# Altium footprint library IC.PCBLIB: 359 footprints (part 9 of 23)
Each footprint in its own frame and in the unit in brackets; x right, y up, seen from the top. Pads: shape width x height; smd on the part's side, far side on the other; paste and mask are expansions set on the pad; w line width, h text height; cw(c..) or ccw(c..) is an arc to the next point about the centre after c.
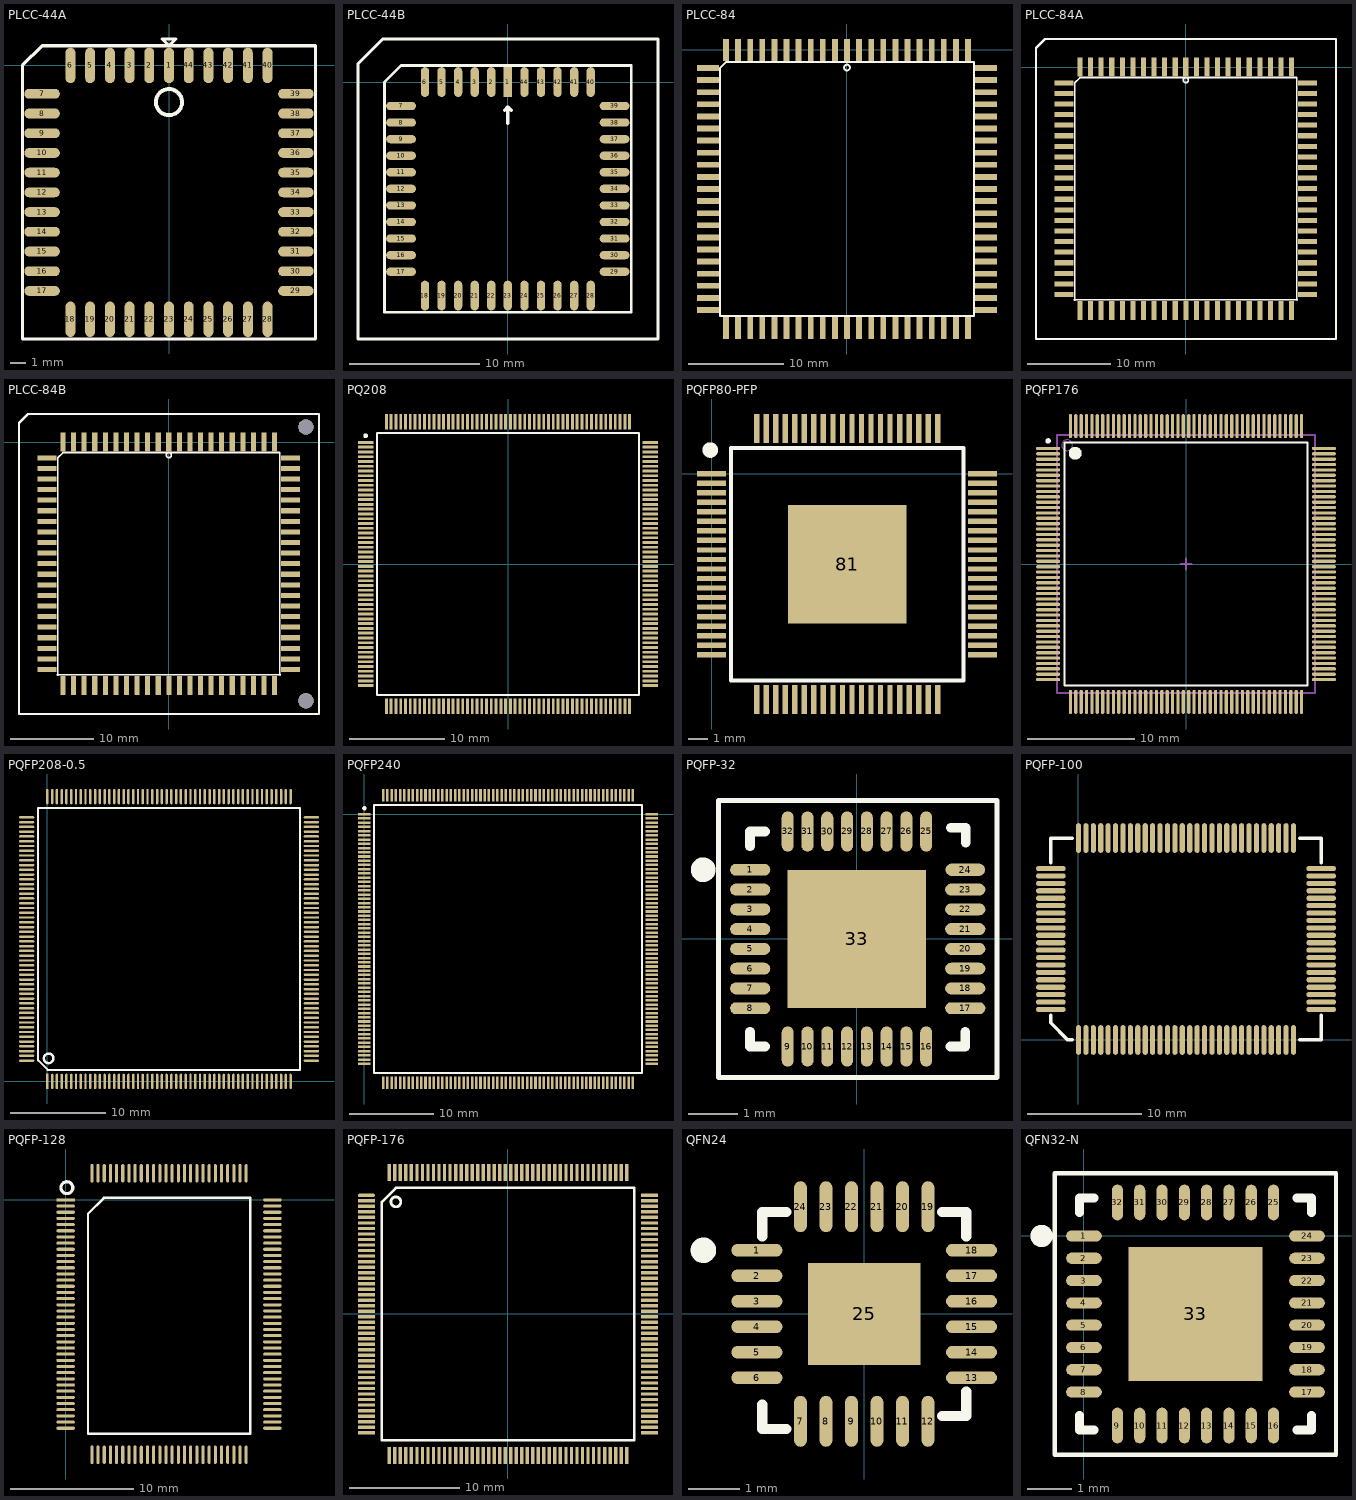
[diagram p8: the footprints below, top view; thin cyan lines are the x and y axes]

## PLCC-44A [mil]
pads (44):
  oval 25x90 smd: 1(0,0) 2(-50,0) 3(-100,0) 4(-150,0) 5(-200,0) 6(-250,0) 18(-250,-644) 19(-200,-644) 20(-150,-644) 21(-100,-644) 22(-50,-644) 23(0,-644) 24(50,-644) 25(100,-644) 26(150,-644) 27(200,-644) 28(250,-644) 40(250,0) 41(200,0) 42(150,0) 43(100,0) 44(50,0)
  oval 90x25 smd: 7(-322,-72) 8(-322,-122) 9(-322,-172) 10(-322,-222) 11(-322,-272) 12(-322,-322) 13(-322,-372) 14(-322,-422) 15(-322,-472) 16(-322,-522) 17(-322,-572) 29(322,-572) 30(322,-522) 31(322,-472) 32(322,-422) 33(322,-372) 34(322,-322) 35(322,-272) 36(322,-222) 37(322,-172) 38(322,-122) 39(322,-72)
TopOverlay:
  lines w8: -372,-694 372,-694 372,50 -322,50 -372,0 -372,-694 ; -17,67 0,67 17,67 0,50 -17,67
  lines w10: 32.87,-90.09 ccw(c-0.12,-93) 33,-93

## PLCC-44B [mil]
pads (44):
  rect 25x90 smd: 1(0,0)
  oval 25x90 smd: 2(-50,0) 3(-100,0) 4(-150,0) 5(-200,0) 6(-250,0) 18(-250,-644) 19(-200,-644) 20(-150,-644) 21(-100,-644) 22(-50,-644) 23(0,-644) 24(50,-644) 25(100,-644) 26(150,-644) 27(200,-644) 28(250,-644) 40(250,0) 41(200,0) 42(150,0) 43(100,0) 44(50,0)
  oval 90x25 smd: 7(-322,-72) 8(-322,-122) 9(-322,-172) 10(-322,-222) 11(-322,-272) 12(-322,-322) 13(-322,-372) 14(-322,-422) 15(-322,-472) 16(-322,-522) 17(-322,-572) 29(322,-572) 30(322,-522) 31(322,-472) 32(322,-422) 33(322,-372) 34(322,-322) 35(322,-272) 36(322,-222) 37(322,-172) 38(322,-122) 39(322,-72)
TopOverlay:
  lines w8: -372,-694 -372,0 -322,50 372,50 372,-694 -372,-694
  lines w10: -10,-85 0,-75 ; 0,-125 0,-75 ; 10,-85 0,-75 ; -452,-775 453,-775 453,130 -377,130 -452,55 -452,-775

## PLCC-84 [mil]
height 100
pads (84):
  rect 24x90 smd: 1(0,0) 2(-49.61,0.28) 3(-99.61,0.28) 4(-149.61,0.28) 5(-199.61,0.28) 6(-249.61,0.28) 7(-299.61,0.28) 8(-349.61,0.28) 9(-399.61,0.28) 10(-449.61,0.28) 11(-499.61,0.28) 33(-499.61,-1149.72) 34(-449.61,-1149.72) 35(-399.61,-1149.72) 36(-349.61,-1149.72) 37(-299.61,-1149.72) 38(-249.61,-1149.72) 39(-199.61,-1149.72) 40(-149.61,-1149.72) 41(-99.61,-1149.72) 42(-49.61,-1149.72) 43(0.39,-1149.72) 44(50.39,-1149.72) 45(100.39,-1149.72) 46(150.39,-1149.72) 47(200.39,-1149.72) 48(250.39,-1149.72) 49(300.39,-1149.72) 50(350.39,-1149.72) 51(400.39,-1149.72) 52(450.39,-1149.72) 53(500.39,-1149.72) 75(500.39,0.28) 76(450.39,0.28) 77(400.39,0.28) 78(350.39,0.28) 79(300.39,0.28) 80(250.39,0.28) 81(200.39,0.28) 82(150.39,0.28) 83(100.39,0.28) 84(50.39,0.28)
  rect 90x24 smd: 12(-574.61,-74.72) 13(-574.61,-124.72) 14(-574.61,-174.72) 15(-574.61,-224.72) 16(-574.61,-274.72) 17(-574.61,-324.72) 18(-574.61,-374.72) 19(-574.61,-424.72) 20(-574.61,-474.72) 21(-574.61,-524.72) 22(-574.61,-574.72) 23(-574.61,-624.72) 24(-574.61,-674.72) 25(-574.61,-724.72) 26(-574.61,-774.72) 27(-574.61,-824.72) 28(-574.61,-874.72) 29(-574.61,-924.72) 30(-574.61,-974.72) 31(-574.61,-1024.72) 32(-574.61,-1074.72) 54(575.39,-1074.72) 55(575.39,-1024.72) 56(575.39,-974.72) 57(575.39,-924.72) 58(575.39,-874.72) 59(575.39,-824.72) 60(575.39,-774.72) 61(575.39,-724.72) 62(575.39,-674.72) 63(575.39,-624.72) 64(575.39,-574.72) 65(575.39,-524.72) 66(575.39,-474.72) 67(575.39,-424.72) 68(575.39,-374.72) 69(575.39,-324.72) 70(575.39,-274.72) 71(575.39,-224.72) 72(575.39,-174.72) 73(575.39,-124.72) 74(575.39,-74.72)
TopOverlay:
  circle w8: c0.39,-72.72 r12
  lines w8: -524.61,-1099.72 525.39,-1099.72 525.39,-49.72 -499.61,-49.72 -524.61,-74.72 -524.61,-1099.72

## PLCC-84A [mil]
height 100
pads (84):
  rect 24x90 smd: 1(0,0) 2(-49.61,0.28) 3(-99.61,0.28) 4(-149.61,0.28) 5(-199.61,0.28) 6(-249.61,0.28) 7(-299.61,0.28) 8(-349.61,0.28) 9(-399.61,0.28) 10(-449.61,0.28) 11(-499.61,0.28) 33(-499.61,-1149.72) 34(-449.61,-1149.72) 35(-399.61,-1149.72) 36(-349.61,-1149.72) 37(-299.61,-1149.72) 38(-249.61,-1149.72) 39(-199.61,-1149.72) 40(-149.61,-1149.72) 41(-99.61,-1149.72) 42(-49.61,-1149.72) 43(0.39,-1149.72) 44(50.39,-1149.72) 45(100.39,-1149.72) 46(150.39,-1149.72) 47(200.39,-1149.72) 48(250.39,-1149.72) 49(300.39,-1149.72) 50(350.39,-1149.72) 51(400.39,-1149.72) 52(450.39,-1149.72) 53(500.39,-1149.72) 75(500.39,0.28) 76(450.39,0.28) 77(400.39,0.28) 78(350.39,0.28) 79(300.39,0.28) 80(250.39,0.28) 81(200.39,0.28) 82(150.39,0.28) 83(100.39,0.28) 84(50.39,0.28)
  rect 90x24 smd: 12(-574.61,-74.72) 13(-574.61,-124.72) 14(-574.61,-174.72) 15(-574.61,-224.72) 16(-574.61,-274.72) 17(-574.61,-324.72) 18(-574.61,-374.72) 19(-574.61,-424.72) 20(-574.61,-474.72) 21(-574.61,-524.72) 22(-574.61,-574.72) 23(-574.61,-624.72) 24(-574.61,-674.72) 25(-574.61,-724.72) 26(-574.61,-774.72) 27(-574.61,-824.72) 28(-574.61,-874.72) 29(-574.61,-924.72) 30(-574.61,-974.72) 31(-574.61,-1024.72) 32(-574.61,-1074.72) 54(575.39,-1074.72) 55(575.39,-1024.72) 56(575.39,-974.72) 57(575.39,-924.72) 58(575.39,-874.72) 59(575.39,-824.72) 60(575.39,-774.72) 61(575.39,-724.72) 62(575.39,-674.72) 63(575.39,-624.72) 64(575.39,-574.72) 65(575.39,-524.72) 66(575.39,-474.72) 67(575.39,-424.72) 68(575.39,-374.72) 69(575.39,-324.72) 70(575.39,-274.72) 71(575.39,-224.72) 72(575.39,-174.72) 73(575.39,-124.72) 74(575.39,-74.72)
TopOverlay:
  circle w8: c0.39,-61.72 r12
  lines w8: -524.61,-1099.72 525.39,-1099.72 525.39,-49.72 -499.61,-49.72 -524.61,-74.72 -524.61,-1099.72
  lines w10: -707.71,89 -707.71,90 ; -524.61,-1099.72 -524.61,-1098.61 ; 525.39,-1100.39 525.39,-1099.72 ; -707.71,90 -665,132.71 710.29,132.71 710.29,-1285.3 -707.71,-1285.3 -707.71,90

## PLCC-84B [mil]
height 100
pads (86):
  rect 24x90 smd: 1(0,0) 2(-49.61,0.28) 3(-99.61,0.28) 4(-149.61,0.28) 5(-199.61,0.28) 6(-249.61,0.28) 7(-299.61,0.28) 8(-349.61,0.28) 9(-399.61,0.28) 10(-449.61,0.28) 11(-499.61,0.28) 33(-499.61,-1149.72) 34(-449.61,-1149.72) 35(-399.61,-1149.72) 36(-349.61,-1149.72) 37(-299.61,-1149.72) 38(-249.61,-1149.72) 39(-199.61,-1149.72) 40(-149.61,-1149.72) 41(-99.61,-1149.72) 42(-49.61,-1149.72) 43(0.39,-1149.72) 44(50.39,-1149.72) 45(100.39,-1149.72) 46(150.39,-1149.72) 47(200.39,-1149.72) 48(250.39,-1149.72) 49(300.39,-1149.72) 50(350.39,-1149.72) 51(400.39,-1149.72) 52(450.39,-1149.72) 53(500.39,-1149.72) 75(500.39,0.28) 76(450.39,0.28) 77(400.39,0.28) 78(350.39,0.28) 79(300.39,0.28) 80(250.39,0.28) 81(200.39,0.28) 82(150.39,0.28) 83(100.39,0.28) 84(50.39,0.28)
  rect 90x24 smd: 12(-574.61,-74.72) 13(-574.61,-124.72) 14(-574.61,-174.72) 15(-574.61,-224.72) 16(-574.61,-274.72) 17(-574.61,-324.72) 18(-574.61,-374.72) 19(-574.61,-424.72) 20(-574.61,-474.72) 21(-574.61,-524.72) 22(-574.61,-574.72) 23(-574.61,-624.72) 24(-574.61,-674.72) 25(-574.61,-724.72) 26(-574.61,-774.72) 27(-574.61,-824.72) 28(-574.61,-874.72) 29(-574.61,-924.72) 30(-574.61,-974.72) 31(-574.61,-1024.72) 32(-574.61,-1074.72) 54(575.39,-1074.72) 55(575.39,-1024.72) 56(575.39,-974.72) 57(575.39,-924.72) 58(575.39,-874.72) 59(575.39,-824.72) 60(575.39,-774.72) 61(575.39,-724.72) 62(575.39,-674.72) 63(575.39,-624.72) 64(575.39,-574.72) 65(575.39,-524.72) 66(575.39,-474.72) 67(575.39,-424.72) 68(575.39,-374.72) 69(575.39,-324.72) 70(575.39,-274.72) 71(575.39,-224.72) 72(575.39,-174.72) 73(575.39,-124.72) 74(575.39,-74.72)
  round 72.83 hole 70.87: ""(648.39,-1222.72) ""(648.39,71.28)
TopOverlay:
  circle w8: c0.39,-61.72 r12
  lines w8: -524.61,-1099.72 525.39,-1099.72 525.39,-49.72 -499.61,-49.72 -524.61,-74.72 -524.61,-1099.72
  lines w10: -707.71,89 -707.71,90 ; -524.61,-1099.72 -524.61,-1098.61 ; 525.39,-1100.39 525.39,-1099.72 ; -707.71,90 -665,132.71 710.29,132.71 710.29,-1285.3 -707.71,-1285.3 -707.71,90

## PQ208 [mm]
height 1.2
pads (208):
  rect 1.6x0.3 smd: 1(-14.925,12.75) 2(-14.925,12.25) 3(-14.925,11.75) 4(-14.925,11.25) 5(-14.925,10.75) 6(-14.925,10.25) 7(-14.925,9.75) 8(-14.925,9.25) 9(-14.925,8.75) 10(-14.925,8.25) 11(-14.925,7.75) 12(-14.925,7.25) 13(-14.925,6.75) 14(-14.925,6.25) 15(-14.925,5.75) 16(-14.925,5.25) 17(-14.925,4.75) 18(-14.925,4.25) 19(-14.925,3.75) 20(-14.925,3.25) 21(-14.925,2.75) 22(-14.925,2.25) 23(-14.925,1.75) 24(-14.925,1.25) 25(-14.925,0.75) 26(-14.925,0.25) 27(-14.925,-0.25) 28(-14.925,-0.75) 29(-14.925,-1.25) 30(-14.925,-1.75) 31(-14.925,-2.25) 32(-14.925,-2.75) 33(-14.925,-3.25) 34(-14.925,-3.75) 35(-14.925,-4.25) 36(-14.925,-4.75) 37(-14.925,-5.25) 38(-14.925,-5.75) 39(-14.925,-6.25) 40(-14.925,-6.75) 41(-14.925,-7.25) 42(-14.925,-7.75) 43(-14.925,-8.25) 44(-14.925,-8.75) 45(-14.925,-9.25) 46(-14.925,-9.75) 47(-14.925,-10.25) 48(-14.925,-10.75) 49(-14.925,-11.25) 50(-14.925,-11.75) 51(-14.925,-12.25) 52(-14.925,-12.75) 105(14.925,-12.75) 106(14.925,-12.25) 107(14.925,-11.75) 108(14.925,-11.25) 109(14.925,-10.75) 110(14.925,-10.25) 111(14.925,-9.75) 112(14.925,-9.25) 113(14.925,-8.75) 114(14.925,-8.25) 115(14.925,-7.75) 116(14.925,-7.25) 117(14.925,-6.75) 118(14.925,-6.25) 119(14.925,-5.75) 120(14.925,-5.25) 121(14.925,-4.75) 122(14.925,-4.25) 123(14.925,-3.75) 124(14.925,-3.25) 125(14.925,-2.75) 126(14.925,-2.25) 127(14.925,-1.75) 128(14.925,-1.25) 129(14.925,-0.75) 130(14.925,-0.25) 131(14.925,0.25) 132(14.925,0.75) 133(14.925,1.25) 134(14.925,1.75) 135(14.925,2.25) 136(14.925,2.75) 137(14.925,3.25) 138(14.925,3.75) 139(14.925,4.25) 140(14.925,4.75) 141(14.925,5.25) 142(14.925,5.75) 143(14.925,6.25) 144(14.925,6.75) 145(14.925,7.25) 146(14.925,7.75) 147(14.925,8.25) 148(14.925,8.75) 149(14.925,9.25) 150(14.925,9.75) 151(14.925,10.25) 152(14.925,10.75) 153(14.925,11.25) 154(14.925,11.75) 155(14.925,12.25) 156(14.925,12.75)
  rect 0.3x1.6 smd: 53(-12.75,-14.925) 54(-12.25,-14.925) 55(-11.75,-14.925) 56(-11.25,-14.925) 57(-10.75,-14.925) 58(-10.25,-14.925) 59(-9.75,-14.925) 60(-9.25,-14.925) 61(-8.75,-14.925) 62(-8.25,-14.925) 63(-7.75,-14.925) 64(-7.25,-14.925) 65(-6.75,-14.925) 66(-6.25,-14.925) 67(-5.75,-14.925) 68(-5.25,-14.925) 69(-4.75,-14.925) 70(-4.25,-14.925) 71(-3.75,-14.925) 72(-3.25,-14.925) 73(-2.75,-14.925) 74(-2.25,-14.925) 75(-1.75,-14.925) 76(-1.25,-14.925) 77(-0.75,-14.925) 78(-0.25,-14.925) 79(0.25,-14.925) 80(0.75,-14.925) 81(1.25,-14.925) 82(1.75,-14.925) 83(2.25,-14.925) 84(2.75,-14.925) 85(3.25,-14.925) 86(3.75,-14.925) 87(4.25,-14.925) 88(4.75,-14.925) 89(5.25,-14.925) 90(5.75,-14.925) 91(6.25,-14.925) 92(6.75,-14.925) 93(7.25,-14.925) 94(7.75,-14.925) 95(8.25,-14.925) 96(8.75,-14.925) 97(9.25,-14.925) 98(9.75,-14.925) 99(10.25,-14.925) 100(10.75,-14.925) 101(11.25,-14.925) 102(11.75,-14.925) 103(12.25,-14.925) 104(12.75,-14.925) 157(12.75,14.925) 158(12.25,14.925) 159(11.75,14.925) 160(11.25,14.925) 161(10.75,14.925) 162(10.25,14.925) 163(9.75,14.925) 164(9.25,14.925) 165(8.75,14.925) 166(8.25,14.925) 167(7.75,14.925) 168(7.25,14.925) 169(6.75,14.925) 170(6.25,14.925) 171(5.75,14.925) 172(5.25,14.925) 173(4.75,14.925) 174(4.25,14.925) 175(3.75,14.925) 176(3.25,14.925) 177(2.75,14.925) 178(2.25,14.925) 179(1.75,14.925) 180(1.25,14.925) 181(0.75,14.925) 182(0.25,14.925) 183(-0.25,14.925) 184(-0.75,14.925) 185(-1.25,14.925) 186(-1.75,14.925) 187(-2.25,14.925) 188(-2.75,14.925) 189(-3.25,14.925) 190(-3.75,14.925) 191(-4.25,14.925) 192(-4.75,14.925) 193(-5.25,14.925) 194(-5.75,14.925) 195(-6.25,14.925) 196(-6.75,14.925) 197(-7.25,14.925) 198(-7.75,14.925) 199(-8.25,14.925) 200(-8.75,14.925) 201(-9.25,14.925) 202(-9.75,14.925) 203(-10.25,14.925) 204(-10.75,14.925) 205(-11.25,14.925) 206(-11.75,14.925) 207(-12.25,14.925) 208(-12.75,14.925)
TopOverlay:
  circle w0.25: c-14.925,13.45 r0.125
  lines w0.2: -13.725,-13.725 13.725,-13.725 13.725,13.725 -13.725,13.725 -13.725,-13.725

## PQFP80-PFP [mil]
height 204
pads (81):
  rect 60x11 smd: 1(0,0) 2(0,-19.68) 3(0,-39.37) 4(0,-59.06) 5(0,-78.74) 6(0,-98.43) 7(0,-118.11) 8(0,-137.8) 9(0,-157.48) 10(0,-177.17) 11(0,-196.85) 12(0,-216.54) 13(0,-236.22) 14(0,-255.91) 15(0,-275.59) 16(0,-295.28) 17(0,-314.96) 18(0,-334.65) 19(0,-354.33) 20(0,-374.02) 41(560,-374.02) 42(560,-354.33) 43(560,-334.65) 44(560,-314.96) 45(560,-295.28) 46(560,-275.59) 47(560,-255.91) 48(560,-236.22) 49(560,-216.54) 50(560,-196.85) 51(560,-177.17) 52(560,-157.48) 53(560,-137.8) 54(560,-118.11) 55(560,-98.43) 56(560,-78.74) 57(560,-59.06) 58(560,-39.37) 59(560,-19.69) 60(560,0)
  rect 11x60 smd: 21(93.43,-466.57) 22(113.11,-466.57) 23(132.8,-466.57) 24(152.48,-466.57) 25(172.17,-466.57) 26(191.85,-466.57) 27(211.54,-466.57) 28(231.22,-466.57) 29(250.91,-466.57) 30(270.59,-466.57) 31(290.28,-466.57) 32(309.96,-466.57) 33(329.65,-466.57) 34(349.33,-466.57) 35(369.02,-466.57) 36(388.7,-466.57) 37(408.39,-466.57) 38(428.07,-466.57) 39(447.76,-466.57) 40(467.44,-466.57) 61(467.44,93.43) 62(447.76,93.43) 63(428.07,93.43) 64(408.39,93.43) 65(388.7,93.43) 66(369.02,93.43) 67(349.33,93.43) 68(329.65,93.43) 69(309.96,93.43) 70(290.28,93.43) 71(270.59,93.43) 72(250.91,93.43) 73(231.22,93.43) 74(211.54,93.43) 75(191.85,93.43) 76(172.17,93.43) 77(152.48,93.43) 78(132.8,93.43) 79(113.11,93.43) 80(93.43,93.43)
  rect 244.09x244.09 smd paste+0 mask+0: 81(280.43,-187.01)
TopOverlay:
  circle w16: c-2.57,48.99 r8
  lines w8: 40.28,-427.17 40.28,53.15 520.59,53.15 520.59,-427.17 40.28,-427.17
TopSolder:
  rectangle: 302,-309 402,-209
  rectangle: 158,-309 258,-209
  rectangle: 303,-165 403,-65
  rectangle: 159,-165 259,-65

## PQFP176 [mm] "TI 28335DSPоƬ"
height 1.6
pads (176):
  oval 2.25x0.3 smd: 1(-12.825,10.75) 2(-12.825,10.25) 3(-12.825,9.75) 4(-12.825,9.25) 5(-12.825,8.75) 6(-12.825,8.25) 7(-12.825,7.75) 8(-12.825,7.25) 9(-12.825,6.75) 10(-12.825,6.25) 11(-12.825,5.75) 12(-12.825,5.25) 13(-12.825,4.75) 14(-12.825,4.25) 15(-12.825,3.75) 16(-12.825,3.25) 17(-12.825,2.75) 18(-12.825,2.25) 19(-12.825,1.75) 20(-12.825,1.25) 21(-12.825,0.75) 22(-12.825,0.25) 23(-12.825,-0.25) 24(-12.825,-0.75) 25(-12.825,-1.25) 26(-12.825,-1.75) 27(-12.825,-2.25) 28(-12.825,-2.75) 29(-12.825,-3.25) 30(-12.825,-3.75) 31(-12.825,-4.25) 32(-12.825,-4.75) 33(-12.825,-5.25) 34(-12.825,-5.75) 35(-12.825,-6.25) 36(-12.825,-6.75) 37(-12.825,-7.25) 38(-12.825,-7.75) 39(-12.825,-8.25) 40(-12.825,-8.75) 41(-12.825,-9.25) 42(-12.825,-9.75) 43(-12.825,-10.25) 44(-12.825,-10.75) 89(12.825,-10.75) 90(12.825,-10.25) 91(12.825,-9.75) 92(12.825,-9.25) 93(12.825,-8.75) 94(12.825,-8.25) 95(12.825,-7.75) 96(12.825,-7.25) 97(12.825,-6.75) 98(12.825,-6.25) 99(12.825,-5.75) 100(12.825,-5.25) 101(12.825,-4.75) 102(12.825,-4.25) 103(12.825,-3.75) 104(12.825,-3.25) 105(12.825,-2.75) 106(12.825,-2.25) 107(12.825,-1.75) 108(12.825,-1.25) 109(12.825,-0.75) 110(12.825,-0.25) 111(12.825,0.25) 112(12.825,0.75) 113(12.825,1.25) 114(12.825,1.75) 115(12.825,2.25) 116(12.825,2.75) 117(12.825,3.25) 118(12.825,3.75) 119(12.825,4.25) 120(12.825,4.75) 121(12.825,5.25) 122(12.825,5.75) 123(12.825,6.25) 124(12.825,6.75) 125(12.825,7.25) 126(12.825,7.75) 127(12.825,8.25) 128(12.825,8.75) 129(12.825,9.25) 130(12.825,9.75) 131(12.825,10.25) 132(12.825,10.75)
  oval 0.3x2.25 smd: 45(-10.75,-12.825) 46(-10.25,-12.825) 47(-9.75,-12.825) 48(-9.25,-12.825) 49(-8.75,-12.825) 50(-8.25,-12.825) 51(-7.75,-12.825) 52(-7.25,-12.825) 53(-6.75,-12.825) 54(-6.25,-12.825) 55(-5.75,-12.825) 56(-5.25,-12.825) 57(-4.75,-12.825) 58(-4.25,-12.825) 59(-3.75,-12.825) 60(-3.25,-12.825) 61(-2.75,-12.825) 62(-2.25,-12.825) 63(-1.75,-12.825) 64(-1.25,-12.825) 65(-0.75,-12.825) 66(-0.25,-12.825) 67(0.25,-12.825) 68(0.75,-12.825) 69(1.25,-12.825) 70(1.75,-12.825) 71(2.25,-12.825) 72(2.75,-12.825) 73(3.25,-12.825) 74(3.75,-12.825) 75(4.25,-12.825) 76(4.75,-12.825) 77(5.25,-12.825) 78(5.75,-12.825) 79(6.25,-12.825) 80(6.75,-12.825) 81(7.25,-12.825) 82(7.75,-12.825) 83(8.25,-12.825) 84(8.75,-12.825) 85(9.25,-12.825) 86(9.75,-12.825) 87(10.25,-12.825) 88(10.75,-12.825) 133(10.75,12.825) 134(10.25,12.825) 135(9.75,12.825) 136(9.25,12.825) 137(8.75,12.825) 138(8.25,12.825) 139(7.75,12.825) 140(7.25,12.825) 141(6.75,12.825) 142(6.25,12.825) 143(5.75,12.825) 144(5.25,12.825) 145(4.75,12.825) 146(4.25,12.825) 147(3.75,12.825) 148(3.25,12.825) 149(2.75,12.825) 150(2.25,12.825) 151(1.75,12.825) 152(1.25,12.825) 153(0.75,12.825) 154(0.25,12.825) 155(-0.25,12.825) 156(-0.75,12.825) 157(-1.25,12.825) 158(-1.75,12.825) 159(-2.25,12.825) 160(-2.75,12.825) 161(-3.25,12.825) 162(-3.75,12.825) 163(-4.25,12.825) 164(-4.75,12.825) 165(-5.25,12.825) 166(-5.75,12.825) 167(-6.25,12.825) 168(-6.75,12.825) 169(-7.25,12.825) 170(-7.75,12.825) 171(-8.25,12.825) 172(-8.75,12.825) 173(-9.25,12.825) 174(-9.75,12.825) 175(-10.25,12.825) 176(-10.75,12.825)
TopOverlay:
  circle w0.25: c-12.825,11.45 r0.125
  circle w0.6: c-10.3,10.3 r0.3
  lines w0.2: -11.3,-11.3 -11.3,11.3 11.3,11.3 11.3,-11.3 -11.3,-11.3
Mechanical13:
  circle w0.1: c-11.05,11.05 r0.5
  lines w0.2: -12,-12 -12,12 12,12 12,-12 -12,-12
Mechanical15:
  lines w0.2: -0.5,0 0.5,0 ; 0,-0.5 0,0.5

## PQFP208-0.5 [mm]
height 1.5
pads (208):
  rect 0.254x1.6 smd: 1(0,0)
  oval 0.254x1.6 smd: 2(0.5,0) 3(1,0) 4(1.5,0) 5(2,0) 6(2.5,0) 7(3,0) 8(3.5,0) 9(4,0) 10(4.5,0) 11(5,0) 12(5.5,0) 13(6,0) 14(6.5,0) 15(7,0) 16(7.5,0) 17(8,0) 18(8.5,0) 19(9,0) 20(9.5,0) 21(10,0) 22(10.5,0) 23(11,0) 24(11.5,0) 25(12,0) 26(12.5,0) 27(13,0) 28(13.5,0) 29(14,0) 30(14.5,0) 31(15,0) 32(15.5,0) 33(16,0) 34(16.5,0) 35(17,0) 36(17.5,0) 37(18,0) 38(18.5,0) 39(19,0) 40(19.5,0) 41(20,0) 42(20.5,0) 43(21,0) 44(21.5,0) 45(22,0) 46(22.5,0) 47(23,0) 48(23.5,0) 49(24,0) 50(24.5,0) 51(25,0) 52(25.5,0) 105(25.5,29.85) 106(25,29.85) 107(24.5,29.85) 108(24,29.85) 109(23.5,29.85) 110(23,29.85) 111(22.5,29.85) 112(22,29.85) 113(21.5,29.85) 114(21,29.85) 115(20.5,29.85) 116(20,29.85) 117(19.5,29.85) 118(19,29.85) 119(18.5,29.85) 120(18,29.85) 121(17.5,29.85) 122(17,29.85) 123(16.5,29.85) 124(16,29.85) 125(15.5,29.85) 126(15,29.85) 127(14.5,29.85) 128(14,29.85) 129(13.5,29.85) 130(13,29.85) 131(12.5,29.85) 132(12,29.85) 133(11.5,29.85) 134(11,29.85) 135(10.5,29.85) 136(10,29.85) 137(9.5,29.85) 138(9,29.85) 139(8.5,29.85) 140(8,29.85) 141(7.5,29.85) 142(7,29.85) 143(6.5,29.85) 144(6,29.85) 145(5.5,29.85) 146(5,29.85) 147(4.5,29.85) 148(4,29.85) 149(3.5,29.85) 150(3,29.85) 151(2.5,29.85) 152(2,29.85) 153(1.5,29.85) 154(1,29.85) 155(0.5,29.85) 156(0,29.85)
  oval 1.6x0.254 smd: 53(27.675,2.175) 54(27.675,2.675) 55(27.675,3.175) 56(27.675,3.675) 57(27.675,4.175) 58(27.675,4.675) 59(27.675,5.175) 60(27.675,5.675) 61(27.675,6.175) 62(27.675,6.675) 63(27.675,7.175) 64(27.675,7.675) 65(27.675,8.175) 66(27.675,8.675) 67(27.675,9.175) 68(27.675,9.675) 69(27.675,10.175) 70(27.675,10.675) 71(27.675,11.175) 72(27.675,11.675) 73(27.675,12.175) 74(27.675,12.675) 75(27.675,13.175) 76(27.675,13.675) 77(27.675,14.175) 78(27.675,14.675) 79(27.675,15.175) 80(27.675,15.675) 81(27.675,16.175) 82(27.675,16.675) 83(27.675,17.175) 84(27.675,17.675) 85(27.675,18.175) 86(27.675,18.675) 87(27.675,19.175) 88(27.675,19.675) 89(27.675,20.175) 90(27.675,20.675) 91(27.675,21.175) 92(27.675,21.675) 93(27.675,22.175) 94(27.675,22.675) 95(27.675,23.175) 96(27.675,23.675) 97(27.675,24.175) 98(27.675,24.675) 99(27.675,25.175) 100(27.675,25.675) 101(27.675,26.175) 102(27.675,26.675) 103(27.675,27.175) 104(27.675,27.675) 157(-2.175,27.675) 158(-2.175,27.175) 159(-2.175,26.675) 160(-2.175,26.175) 161(-2.175,25.675) 162(-2.175,25.175) 163(-2.175,24.675) 164(-2.175,24.175) 165(-2.175,23.675) 166(-2.175,23.175) 167(-2.175,22.675) 168(-2.175,22.175) 169(-2.175,21.675) 170(-2.175,21.175) 171(-2.175,20.675) 172(-2.175,20.175) 173(-2.175,19.675) 174(-2.175,19.175) 175(-2.175,18.675) 176(-2.175,18.175) 177(-2.175,17.675) 178(-2.175,17.175) 179(-2.175,16.675) 180(-2.175,16.175) 181(-2.175,15.675) 182(-2.175,15.175) 183(-2.175,14.675) 184(-2.175,14.175) 185(-2.175,13.675) 186(-2.175,13.175) 187(-2.175,12.675) 188(-2.175,12.175) 189(-2.175,11.675) 190(-2.175,11.175) 191(-2.175,10.675) 192(-2.175,10.175) 193(-2.175,9.675) 194(-2.175,9.175) 195(-2.175,8.675) 196(-2.175,8.175) 197(-2.175,7.675) 198(-2.175,7.175) 199(-2.175,6.675) 200(-2.175,6.175) 201(-2.175,5.675) 202(-2.175,5.175) 203(-2.175,4.675) 204(-2.175,4.175) 205(-2.175,3.675) 206(-2.175,3.175) 207(-2.175,2.675) 208(-2.175,2.175)
TopOverlay:
  circle w0.25: c0.135,2.413 r0.5
  lines w0.2: -0.975,2.2 -0.975,28.65 26.475,28.65 26.475,1.2 0.025,1.2
  lines w0.203: -0.975,2.2 0.025,1.2

## PQFP240 [mm]
pads (240):
  rect 1.5x0.3 smd: 1(0,0) 2(0,-0.5) 3(0,-1) 4(0,-1.5) 5(0,-2) 6(0,-2.5) 7(0,-3) 8(0,-3.5) 9(0,-4) 10(0,-4.5) 11(0,-5) 12(0,-5.5) 13(0,-6) 14(0,-6.5) 15(0,-7) 16(0,-7.5) 17(0,-8) 18(0,-8.5) 19(0,-9) 20(0,-9.5) 21(0,-10) 22(0,-10.5) 23(0,-11) 24(0,-11.5) 25(0,-12) 26(0,-12.5) 27(0,-13) 28(0,-13.5) 29(0,-14) 30(0,-14.5) 31(0,-15) 32(0,-15.5) 33(0,-16) 34(0,-16.5) 35(0,-17) 36(0,-17.5) 37(0,-18) 38(0,-18.5) 39(0,-19) 40(0,-19.5) 41(0,-20) 42(0,-20.5) 43(0,-21) 44(0,-21.5) 45(0,-22) 46(0,-22.5) 47(0,-23) 48(0,-23.5) 49(0,-24) 50(0,-24.5) 51(0,-25) 52(0,-25.5) 53(0,-26) 54(0,-26.5) 55(0,-27) 56(0,-27.5) 57(0,-28) 58(0,-28.5) 59(0,-29) 60(0,-29.5) 121(33.95,-29.5) 122(33.95,-29) 123(33.95,-28.5) 124(33.95,-28) 125(33.95,-27.5) 126(33.95,-27) 127(33.95,-26.5) 128(33.95,-26) 129(33.95,-25.5) 130(33.95,-25) 131(33.95,-24.5) 132(33.95,-24) 133(33.95,-23.5) 134(33.95,-23) 135(33.95,-22.5) 136(33.95,-22) 137(33.95,-21.5) 138(33.95,-21) 139(33.95,-20.5) 140(33.95,-20) 141(33.95,-19.5) 142(33.95,-19) 143(33.95,-18.5) 144(33.95,-18) 145(33.95,-17.5) 146(33.95,-17) 147(33.95,-16.5) 148(33.95,-16) 149(33.95,-15.5) 150(33.95,-15) 151(33.95,-14.5) 152(33.95,-14) 153(33.95,-13.5) 154(33.95,-13) 155(33.95,-12.5) 156(33.95,-12) 157(33.95,-11.5) 158(33.95,-11) 159(33.95,-10.5) 160(33.95,-10) 161(33.95,-9.5) 162(33.95,-9) 163(33.95,-8.5) 164(33.95,-8) 165(33.95,-7.5) 166(33.95,-7) 167(33.95,-6.5) 168(33.95,-6) 169(33.95,-5.5) 170(33.95,-5) 171(33.95,-4.5) 172(33.95,-4) 173(33.95,-3.5) 174(33.95,-3) 175(33.95,-2.5) 176(33.95,-2) 177(33.95,-1.5) 178(33.95,-1) 179(33.95,-0.5) 180(33.95,0)
  rect 0.3x1.5 smd: 61(2.225,-31.725) 62(2.725,-31.725) 63(3.225,-31.725) 64(3.725,-31.725) 65(4.225,-31.725) 66(4.725,-31.725) 67(5.225,-31.725) 68(5.725,-31.725) 69(6.225,-31.725) 70(6.725,-31.725) 71(7.225,-31.725) 72(7.725,-31.725) 73(8.225,-31.725) 74(8.725,-31.725) 75(9.225,-31.725) 76(9.725,-31.725) 77(10.225,-31.725) 78(10.725,-31.725) 79(11.225,-31.725) 80(11.725,-31.725) 81(12.225,-31.725) 82(12.725,-31.725) 83(13.225,-31.725) 84(13.725,-31.725) 85(14.225,-31.725) 86(14.725,-31.725) 87(15.225,-31.725) 88(15.725,-31.725) 89(16.225,-31.725) 90(16.725,-31.725) 91(17.225,-31.725) 92(17.725,-31.725) 93(18.225,-31.725) 94(18.725,-31.725) 95(19.225,-31.725) 96(19.725,-31.725) 97(20.225,-31.725) 98(20.725,-31.725) 99(21.225,-31.725) 100(21.725,-31.725) 101(22.225,-31.725) 102(22.725,-31.725) 103(23.225,-31.725) 104(23.725,-31.725) 105(24.225,-31.725) 106(24.725,-31.725) 107(25.225,-31.725) 108(25.725,-31.725) 109(26.225,-31.725) 110(26.725,-31.725) 111(27.225,-31.725) 112(27.725,-31.725) 113(28.225,-31.725) 114(28.725,-31.725) 115(29.225,-31.725) 116(29.725,-31.725) 117(30.225,-31.725) 118(30.725,-31.725) 119(31.225,-31.725) 120(31.725,-31.725) 181(31.725,2.225) 182(31.225,2.225) 183(30.725,2.225) 184(30.225,2.225) 185(29.725,2.225) 186(29.225,2.225) 187(28.725,2.225) 188(28.225,2.225) 189(27.725,2.225) 190(27.225,2.225) 191(26.725,2.225) 192(26.225,2.225) 193(25.725,2.225) 194(25.225,2.225) 195(24.725,2.225) 196(24.225,2.225) 197(23.725,2.225) 198(23.225,2.225) 199(22.725,2.225) 200(22.225,2.225) 201(21.725,2.225) 202(21.225,2.225) 203(20.725,2.225) 204(20.225,2.225) 205(19.725,2.225) 206(19.225,2.225) 207(18.725,2.225) 208(18.225,2.225) 209(17.725,2.225) 210(17.225,2.225) 211(16.725,2.225) 212(16.225,2.225) 213(15.725,2.225) 214(15.225,2.225) 215(14.725,2.225) 216(14.225,2.225) 217(13.725,2.225) 218(13.225,2.225) 219(12.725,2.225) 220(12.225,2.225) 221(11.725,2.225) 222(11.225,2.225) 223(10.725,2.225) 224(10.225,2.225) 225(9.725,2.225) 226(9.225,2.225) 227(8.725,2.225) 228(8.225,2.225) 229(7.725,2.225) 230(7.225,2.225) 231(6.725,2.225) 232(6.225,2.225) 233(5.725,2.225) 234(5.225,2.225) 235(4.725,2.225) 236(4.225,2.225) 237(3.725,2.225) 238(3.225,2.225) 239(2.725,2.225) 240(2.225,2.225)
TopOverlay:
  circle w0.25: c0,0.7 r0.125
  lines w0.2: 1.15,-30.575 32.8,-30.575 32.8,1.075 1.15,1.075 1.15,-30.575

## PQFP-32 [mil]
height 204
pads (33):
  oval 32x9.5 smd: 1(-85,55.12) 2(-85,39.37) 3(-85,23.62) 4(-85,7.87) 5(-85,-7.87) 6(-85,-23.62) 7(-85,-39.37) 8(-85,-55.12) 17(86.26,-55.12) 18(86.26,-39.37) 19(86.26,-23.62) 20(86.26,-7.87) 21(86.26,7.87) 22(86.26,23.62) 23(86.26,39.37)
  oval 9.5x32 smd: 9(-55.12,-85.63) 10(-39.37,-85.63) 11(-23.62,-85.63) 12(-7.87,-85.63) 13(7.87,-85.63) 14(23.62,-85.63) 15(39.37,-85.63) 16(55.12,-85.63) 25(55.12,85.63) 26(39.37,85.63) 27(23.62,85.63) 28(7.87,85.63) 29(-7.87,85.63) 31(-39.37,85.63) 32(-55.12,85.63)
  oval 31.5x9.84 smd: 24(86.26,55.12)
  oval 9.84x31.5 smd: 30(-23.62,85.63)
  rect 110.24x110.24 smd paste+0 mask+0: 33(0,0)
TopOverlay:
  circle w9.84: c-122.4,55.12 r4.92
  lines w3.94: -110.24,-110.24 111.5,-110.24 111.5,110.24 -110.24,110.24 -110.24,-110.24
  lines w7.87: -85,-73.82 -85,-85.63 -73.19,-85.63 ; -85,73.82 -85,85.63 -73.19,85.63 ; 74.45,-85.63 86.26,-85.63 86.26,-73.82 ; 74.85,88.58 86.66,88.58 86.66,76.77
TopSolder:
  rectangle: -55,-55 -5,-5
  rectangle: 5,5 55,55
  rectangle: -55,5 -5,55
  rectangle: 5,-55 55,-5

## PQFP-100 [mm] "QPF(14x20mm) e=0.65"
height 3
pads (100):
  oval 0.45x2.6 smd: 1(0,0) 2(0.65,0) 3(1.3,0) 4(1.95,0) 5(2.6,0) 6(3.25,0) 7(3.9,0) 8(4.55,0) 9(5.2,0) 10(5.85,0) 11(6.5,0) 12(7.15,0) 13(7.8,0) 14(8.45,0) 15(9.1,0) 16(9.75,0) 17(10.4,0) 18(11.05,0) 19(11.7,0) 20(12.35,0) 21(13,0) 22(13.65,0) 23(14.3,0) 24(14.95,0) 25(15.6,0) 26(16.25,0) 27(16.9,0) 28(17.55,0) 29(18.2,0) 30(18.85,0) 51(18.85,17.7) 52(18.2,17.7) 53(17.55,17.7) 54(16.9,17.7) 55(16.25,17.7) 56(15.6,17.7) 57(14.95,17.7) 58(14.3,17.7) 59(13.65,17.7) 60(13,17.7) 61(12.35,17.7) 62(11.7,17.7) 63(11.05,17.7) 64(10.4,17.7) 65(9.75,17.7) 66(9.1,17.7) 67(8.45,17.7) 68(7.8,17.7) 69(7.15,17.7) 70(6.5,17.7) 71(5.85,17.7) 72(5.2,17.7) 73(4.55,17.7) 74(3.9,17.7) 75(3.25,17.7) 76(2.6,17.7) 77(1.95,17.7) 78(1.3,17.7) 79(0.65,17.7) 80(0,17.7)
  oval 2.6x0.45 smd: 31(21.275,2.675) 32(21.275,3.325) 33(21.275,3.975) 34(21.275,4.625) 35(21.275,5.275) 36(21.275,5.925) 37(21.275,6.575) 38(21.275,7.225) 39(21.275,7.875) 40(21.275,8.525) 41(21.275,9.175) 42(21.275,9.825) 43(21.275,10.475) 44(21.275,11.125) 45(21.275,11.775) 46(21.275,12.425) 47(21.275,13.075) 48(21.275,13.725) 49(21.275,14.375) 50(21.275,15.025) 81(-2.425,15.025) 82(-2.425,14.375) 83(-2.425,13.725) 84(-2.425,13.075) 85(-2.425,12.425) 86(-2.425,11.775) 87(-2.425,11.125) 88(-2.425,10.475) 89(-2.425,9.825) 90(-2.425,9.175) 91(-2.425,8.525) 92(-2.425,7.875) 93(-2.425,7.225) 94(-2.425,6.575) 95(-2.425,5.925) 96(-2.425,5.275) 97(-2.425,4.625) 98(-2.425,3.975) 99(-2.425,3.325) 100(-2.425,2.675)
TopOverlay:
  lines w0.305: -2.425,1.5 -0.925,0 ; -2.425,1.524 -2.425,2.15 ; -2.425,15.551 -2.425,17.7 -0.525,17.7 ; -0.901,0 -0.525,0 ; 19.375,0 21.275,0 21.275,2.15 ; 19.375,17.7 21.275,17.7 21.275,15.55

## PQFP-128 [mm]
pads (128):
  rect 1.5x0.25 smd: 1(0,0)
  oval 1.5x0.25 smd: 2(0,-0.5) 3(0,-1) 4(0,-1.5) 5(0,-2) 6(0,-2.5) 7(0,-3) 8(0,-3.5) 9(0,-4) 10(0,-4.5) 11(0,-5) 12(0,-5.5) 13(0,-6) 14(0,-6.5) 15(0,-7) 16(0,-7.5) 17(0,-8) 18(0,-8.5) 19(0,-9) 20(0,-9.5) 21(0,-10) 22(0,-10.5) 23(0,-11) 24(0,-11.5) 25(0,-12) 26(0,-12.5) 27(0,-13) 28(0,-13.5) 29(0,-14) 30(0,-14.5) 31(0,-15) 32(0,-15.5) 33(0,-16) 34(0,-16.5) 35(0,-17) 36(0,-17.5) 37(0,-18) 38(0,-18.5) 65(16.764,-18.5) 66(16.764,-18) 67(16.764,-17.5) 68(16.764,-17) 69(16.764,-16.5) 70(16.764,-16) 71(16.764,-15.5) 72(16.764,-15) 73(16.764,-14.5) 74(16.764,-14) 75(16.764,-13.5) 76(16.764,-13) 77(16.764,-12.5) 78(16.764,-12) 79(16.764,-11.5) 80(16.764,-11) 81(16.764,-10.5) 82(16.764,-10) 83(16.764,-9.5) 84(16.764,-9) 85(16.764,-8.5) 86(16.764,-8) 87(16.764,-7.5) 88(16.764,-7) 89(16.764,-6.5) 90(16.764,-6) 91(16.764,-5.5) 92(16.764,-5) 93(16.764,-4.5) 94(16.764,-4) 95(16.764,-3.5) 96(16.764,-3) 97(16.764,-2.5) 98(16.764,-2) 99(16.764,-1.5) 100(16.764,-1) 101(16.764,-0.5) 102(16.764,0)
  oval 0.25x1.5 smd: 39(2.136,-20.65) 40(2.636,-20.65) 41(3.136,-20.65) 42(3.636,-20.65) 43(4.136,-20.65) 44(4.636,-20.65) 45(5.136,-20.65) 46(5.636,-20.65) 47(6.136,-20.65) 48(6.636,-20.65) 49(7.136,-20.65) 50(7.636,-20.65) 51(8.136,-20.65) 52(8.636,-20.65) 53(9.136,-20.65) 54(9.636,-20.65) 55(10.136,-20.65) 56(10.636,-20.65) 57(11.136,-20.65) 58(11.636,-20.65) 59(12.136,-20.65) 60(12.636,-20.65) 61(13.136,-20.65) 62(13.636,-20.65) 63(14.136,-20.65) 64(14.636,-20.65) 103(14.636,2.159) 104(14.136,2.159) 105(13.636,2.159) 106(13.136,2.159) 107(12.636,2.159) 108(12.136,2.159) 109(11.636,2.159) 110(11.136,2.159) 111(10.636,2.159) 112(10.136,2.159) 113(9.636,2.159) 114(9.136,2.159) 115(8.636,2.159) 116(8.136,2.159) 117(7.636,2.159) 118(7.136,2.159) 119(6.636,2.159) 120(6.136,2.159) 121(5.636,2.159) 122(5.136,2.159) 123(4.636,2.159) 124(4.136,2.159) 125(3.636,2.159) 126(3.136,2.159) 127(2.636,2.159) 128(2.136,2.159)
TopOverlay:
  circle w0.254: c0.103,0.991 r0.483
  lines w0.2: 1.818,-18.967 1.818,-1.122 3.103,0.163 14.948,0.163 14.948,-18.967 1.818,-18.967

## PQFP-176 [mil]
height 110
pads (176):
  oval 60x12 smd: 1(-505,423.23)
  rect 60x12 smd: 2(-505,403.54) 3(-505,383.86) 4(-505,364.17) 5(-505,344.49) 6(-505,324.8) 7(-505,305.12) 8(-505,285.43) 9(-505,265.75) 10(-505,246.06) 11(-505,226.38) 12(-505,206.69) 13(-505,187.01) 14(-505,167.32) 15(-505,147.64) 16(-505,127.95) 17(-505,108.27) 18(-505,88.58) 19(-505,68.9) 20(-505,49.21) 21(-505,29.53) 22(-505,9.84) 23(-505,-9.84) 24(-505,-29.53) 25(-505,-49.21) 26(-505,-68.9) 27(-505,-88.58) 28(-505,-108.27) 29(-505,-127.95) 30(-505,-147.64) 31(-505,-167.32) 32(-505,-187.01) 33(-505,-206.69) 34(-505,-226.38) 35(-505,-246.06) 36(-505,-265.75) 37(-505,-285.43) 38(-505,-305.12) 39(-505,-324.8) 40(-505,-344.49) 41(-505,-364.17) 42(-505,-383.86) 43(-505,-403.54) 44(-505,-423.23) 89(505,-423.23) 90(505,-403.54) 91(505,-383.86) 92(505,-364.17) 93(505,-344.49) 94(505,-324.8) 95(505,-305.12) 96(505,-285.43) 97(505,-265.75) 98(505,-246.06) 99(505,-226.38) 100(505,-206.69) 101(505,-187.01) 102(505,-167.32) 103(505,-147.64) 104(505,-127.95) 105(505,-108.27) 106(505,-88.58) 107(505,-68.9) 108(505,-49.21) 109(505,-29.53) 110(505,-9.84) 111(505,9.84) 112(505,29.53) 113(505,49.21) 114(505,68.9) 115(505,88.58) 116(505,108.27) 117(505,127.95) 118(505,147.64) 119(505,167.32) 120(505,187.01) 121(505,206.69) 122(505,226.38) 123(505,246.06) 124(505,265.75) 125(505,285.43) 126(505,305.12) 127(505,324.8) 128(505,344.49) 129(505,364.17) 130(505,383.86) 131(505,403.54) 132(505,423.23)
  rect 12x60 smd: 45(-423.23,-505) 46(-403.54,-505) 47(-383.86,-505) 48(-364.17,-505) 49(-344.49,-505) 50(-324.8,-505) 51(-305.12,-505) 52(-285.43,-505) 53(-265.75,-505) 54(-246.06,-505) 55(-226.38,-505) 56(-206.69,-505) 57(-187.01,-505) 58(-167.32,-505) 59(-147.64,-505) 60(-127.95,-505) 61(-108.27,-505) 62(-88.58,-505) 63(-68.9,-505) 64(-49.21,-505) 65(-29.53,-505) 66(-9.84,-505) 67(9.84,-505) 68(29.53,-505) 69(49.21,-505) 70(68.9,-505) 71(88.58,-505) 72(108.27,-505) 73(127.95,-505) 74(147.64,-505) 75(167.32,-505) 76(187.01,-505) 77(206.69,-505) 78(226.38,-505) 79(246.06,-505) 80(265.75,-505) 81(285.43,-505) 82(305.12,-505) 83(324.8,-505) 84(344.49,-505) 85(364.17,-505) 86(383.86,-505) 87(403.54,-505) 88(423.23,-505) 133(423.23,505) 134(403.54,505) 135(383.86,505) 136(364.17,505) 137(344.49,505) 138(324.8,505) 139(305.12,505) 140(285.43,505) 141(265.75,505) 142(246.06,505) 143(226.38,505) 144(206.69,505) 145(187.01,505) 146(167.32,505) 147(147.64,505) 148(127.95,505) 149(108.27,505) 150(88.58,505) 151(68.9,505) 152(49.21,505) 153(29.53,505) 154(9.84,505) 155(-9.84,505) 156(-29.53,505) 157(-49.21,505) 158(-68.9,505) 159(-88.58,505) 160(-108.27,505) 161(-127.95,505) 162(-147.64,505) 163(-167.32,505) 164(-187.01,505) 165(-206.69,505) 166(-226.38,505) 167(-246.06,505) 168(-265.75,505) 169(-285.43,505) 170(-305.12,505) 171(-324.8,505) 172(-344.49,505) 173(-364.17,505) 174(-383.86,505) 175(-403.54,505) 176(-423.23,505)
TopOverlay:
  circle w10: c-400,400 r17.69
  lines w10: -450,-450 450,-450 450,450 -400,450 -450,400 -450,-450

## QFN24 [mm]
pads (25):
  oval 1x0.25 smd: 1(-2.104,1.25) 2(-2.104,0.75) 3(-2.104,0.25) 4(-2.104,-0.25) 5(-2.104,-0.75) 6(-2.104,-1.25) 13(2.104,-1.25) 14(2.104,-0.75) 15(2.104,-0.25) 16(2.104,0.25) 17(2.104,0.75) 18(2.104,1.25)
  oval 0.25x1 smd: 7(-1.25,-2.104) 8(-0.75,-2.104) 9(-0.25,-2.104) 10(0.25,-2.104) 11(0.75,-2.104) 12(1.25,-2.104) 19(1.25,2.104) 20(0.75,2.104) 21(0.25,2.104) 22(-0.25,2.104) 23(-0.75,2.104) 24(-1.25,2.104)
  rect 2.2x2 smd: 25(0,0)
TopOverlay:
  circle w0.25: c-3.154,1.25 r0.125
  lines w0.2: -2,-1.779 -2,-2.254 -1.525,-2.254 ; -2,1.525 -2,2 -1.525,2 ; 1.525,-2 2,-2 2,-1.525 ; 1.525,2 2,2 2,1.525

## QFN32-N [mm]
pads (33):
  oval 0.8x0.25 smd: 1(0,0) 2(0,-0.5) 3(0,-1) 4(0,-1.5) 5(0,-2) 6(0,-2.5) 7(0,-3) 8(0,-3.5) 17(5,-3.5) 18(5,-3) 19(5,-2.5) 20(5,-2) 21(5,-1.5) 22(5,-1) 23(5,-0.5) 24(5,0)
  oval 0.25x0.8 smd: 9(0.75,-4.25) 10(1.25,-4.25) 11(1.75,-4.25) 12(2.25,-4.25) 13(2.75,-4.25) 14(3.25,-4.25) 15(3.75,-4.25) 16(4.25,-4.25) 25(4.25,0.75) 26(3.75,0.75) 27(3.25,0.75) 28(2.75,0.75) 29(2.25,0.75) 30(1.75,0.75) 31(1.25,0.75) 32(0.75,0.75)
  rect 3x3 smd: 33(2.5,-1.75)
TopOverlay:
  circle w0.25: c-0.95,0 r0.125
  lines w0.1: -0.65,-4.9 -0.65,1.4 5.65,1.4 5.65,-4.9 -0.65,-4.9
  lines w0.2: -0.1,-4.025 -0.1,-4.35 0.225,-4.35 ; -0.1,0.525 -0.1,0.85 0.225,0.85 ; 4.775,-4.35 5.1,-4.35 5.1,-4.025 ; 4.775,0.85 5.1,0.85 5.1,0.525
TopSolder:
  rectangle: 2.718,-3.251 3.988,-1.981
  rectangle: 1.016,-3.251 2.286,-1.981
  rectangle: 2.718,-1.524 3.988,-0.254
  rectangle: 1.016,-1.524 2.286,-0.254